# Altium footprint library PcbLib.PcbLib: 428 footprints (part 10 of 27)
Each footprint in its own frame and in the unit in brackets; x right, y up, seen from the top. Pads: shape width x height; smd on the part's side, far side on the other; paste and mask are expansions set on the pad; w line width, h text height; cw(c..) or ccw(c..) is an arc to the next point about the centre after c.
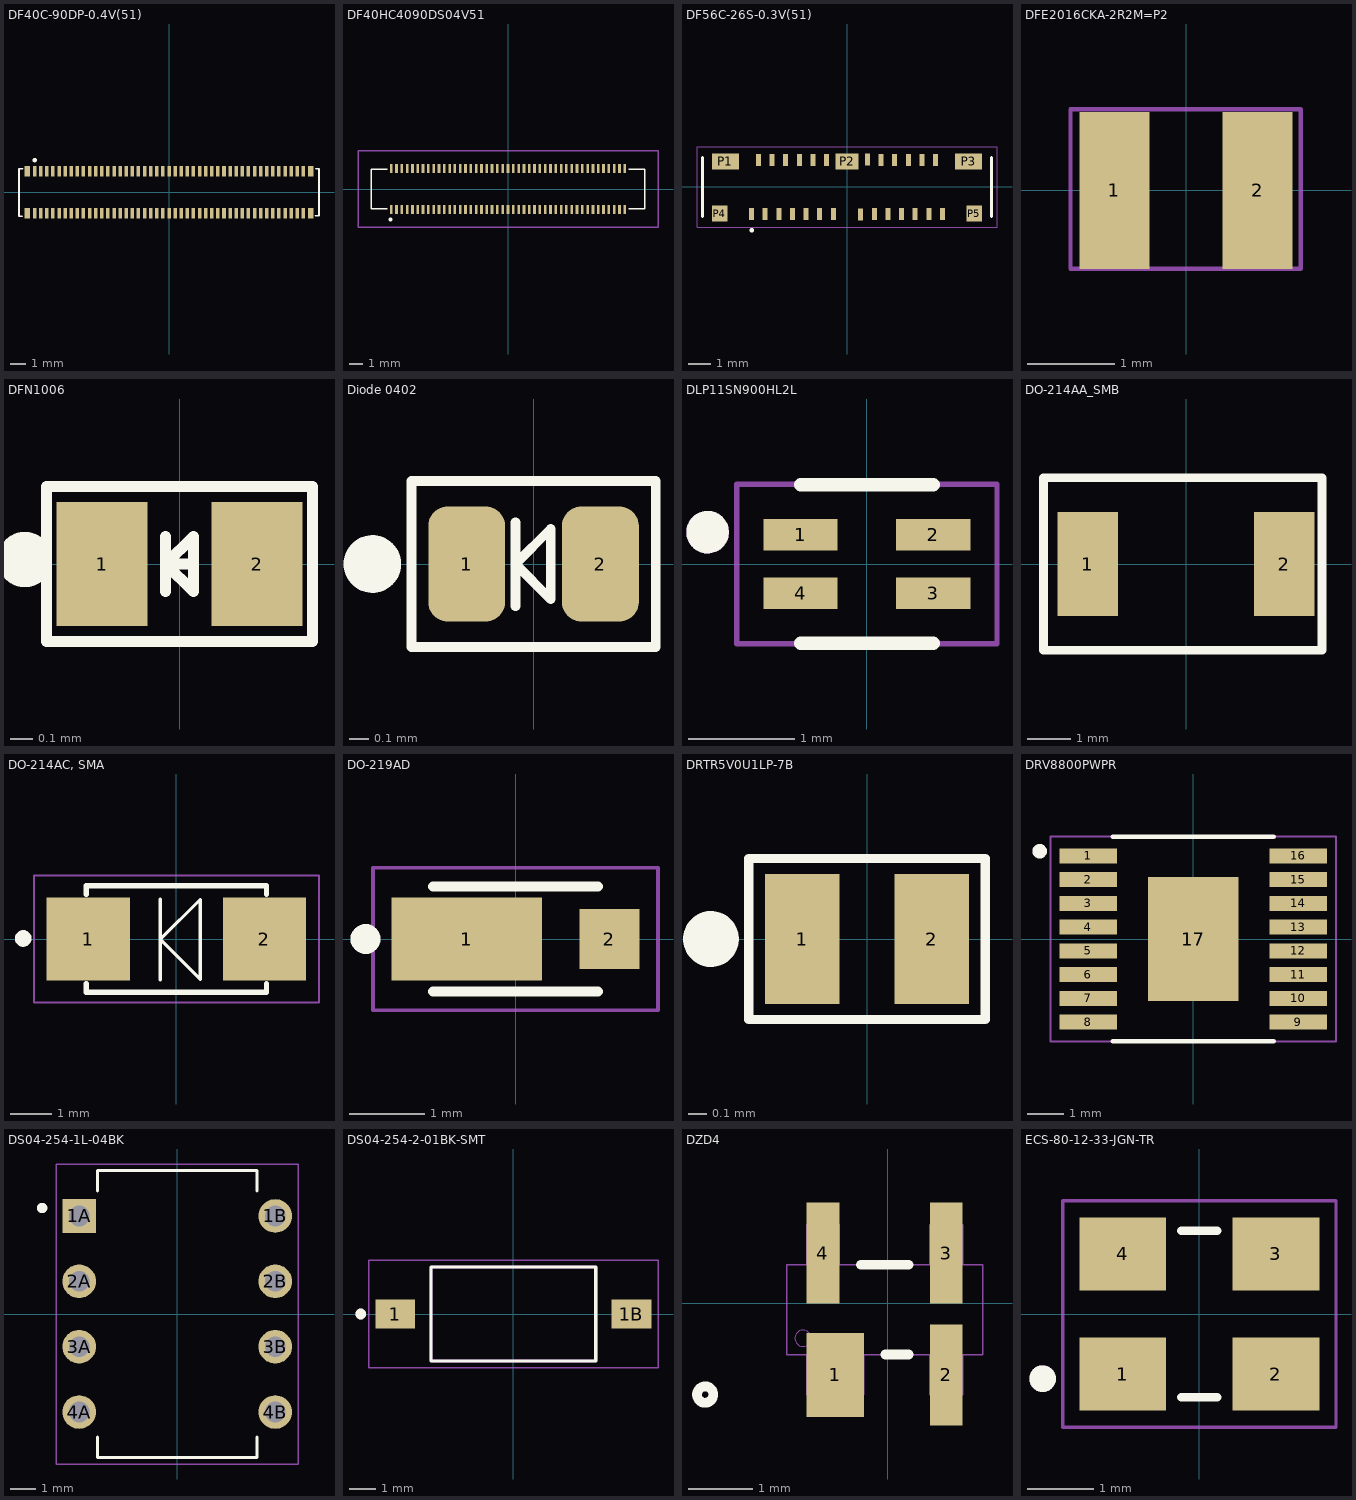
[diagram p9: the footprints below, top view; thin cyan lines are the x and y axes]

## DF40C-90DP-0.4V(51) [mm]
pads (94):
  rect 0.23x0.7 smd: 1(-8.8,1.37) 2(-8.4,1.37) 3(-8,1.37) 4(-7.6,1.37) 5(-7.2,1.37) 6(-6.8,1.37) 7(-6.4,1.37) 8(-6,1.37) 9(-5.6,1.37) 10(-5.2,1.37) 11(-4.8,1.37) 12(-4.4,1.37) 13(-4,1.37) 14(-3.6,1.37) 15(-3.2,1.37) 16(-2.8,1.37) 17(-2.4,1.37) 18(-2,1.37) 19(-1.6,1.37) 20(-1.2,1.37) 21(-0.8,1.37) 22(-0.4,1.37) 23(0,1.37) 24(0.4,1.37) 25(0.8,1.37) 26(1.2,1.37) 27(1.6,1.37) 28(2,1.37) 29(2.4,1.37) 30(2.8,1.37) 31(3.2,1.37) 32(3.6,1.37) 33(4,1.37) 34(4.4,1.37) 35(4.8,1.37) 36(5.2,1.37) 37(5.6,1.37) 38(6,1.37) 39(6.4,1.37) 40(6.8,1.37) 41(7.2,1.37) 42(7.6,1.37) 43(8,1.37) 44(8.4,1.37) 45(8.8,1.37) 46(8.8,-1.38) 47(8.4,-1.38) 48(8,-1.38) 49(7.6,-1.38) 50(7.2,-1.38) 51(6.8,-1.38) 52(6.4,-1.38) 53(6,-1.38) 54(5.6,-1.38) 55(5.2,-1.38) 56(4.8,-1.38) 57(4.4,-1.38) 58(4,-1.38) 59(3.6,-1.38) 60(3.2,-1.38) 61(2.8,-1.38) 62(2.4,-1.38) 63(2,-1.38) 64(1.6,-1.38) 65(1.2,-1.38) 66(0.8,-1.38) 67(0.4,-1.38) 68(0,-1.38) 69(-0.4,-1.38) 70(-0.8,-1.38) 71(-1.2,-1.38) 72(-1.6,-1.38) 73(-2,-1.38) 74(-2.4,-1.38) 75(-2.8,-1.38) 76(-3.2,-1.38) 77(-3.6,-1.38) 78(-4,-1.38) 79(-4.4,-1.38) 80(-4.8,-1.38) 81(-5.2,-1.38) 82(-5.6,-1.38) 83(-6,-1.38) 84(-6.4,-1.38) 85(-6.8,-1.38) 86(-7.2,-1.38) 87(-7.6,-1.38) 88(-8,-1.38) 89(-8.4,-1.38) 90(-8.8,-1.38)
  rect 0.35x0.7 smd: S1(-9.275,-1.38) S2(9.275,-1.38) S3(9.275,1.37) S4(-9.275,1.37)
Top Overlay:
  lines w0.1: -9.605,-1.561 -9.823,-1.561 -9.823,1.54 -9.586,1.54 ; 9.591,-1.55 9.821,-1.55 9.821,1.537 9.614,1.537
  lines w0.2: -8.843,2.108 ccw(c-8.793,2.108) -8.743,2.108 ; -8.843,2.108 ccw(c-8.793,2.108) -8.743,2.108 ; -8.843,2.108 cw(c-8.793,2.108) -8.743,2.108
3D body "df40c-90dp-0_4v_51_.stp": height 1.14, standoff 0, extent -9.757,-1.497 9.763,1.473

## DF40HC4090DS04V51 [mm]
pads (90):
  rect 0.2x0.7 smd: 1(-8.8,-1.54) 2(-8.4,-1.54) 3(-8,-1.54) 4(-7.6,-1.54) 5(-7.2,-1.54) 6(-6.8,-1.54) 7(-6.4,-1.54) 8(-6,-1.54) 9(-5.6,-1.54) 10(-5.2,-1.54) 11(-4.8,-1.54) 12(-4.4,-1.54) 13(-4,-1.54) 14(-3.6,-1.54) 15(-3.2,-1.54) 16(-2.8,-1.54) 17(-2.4,-1.54) 18(-2,-1.54) 19(-1.6,-1.54) 20(-1.2,-1.54) 21(-0.8,-1.54) 22(-0.4,-1.54) 23(0,-1.54) 24(0.4,-1.54) 25(0.8,-1.54) 26(1.2,-1.54) 27(1.6,-1.54) 28(2,-1.54) 29(2.4,-1.54) 30(2.8,-1.54) 31(3.2,-1.54) 32(3.6,-1.54) 33(4,-1.54) 34(4.4,-1.54) 35(4.8,-1.54) 36(5.2,-1.54) 37(5.6,-1.54) 38(6,-1.54) 39(6.4,-1.54) 40(6.8,-1.54) 41(7.2,-1.54) 42(7.6,-1.54) 43(8,-1.54) 44(8.4,-1.54) 45(8.8,-1.54) 46(8.8,1.54) 47(8.4,1.54) 48(8,1.54) 49(7.6,1.54) 50(7.2,1.54) 51(6.8,1.54) 52(6.4,1.54) 53(6,1.54) 54(5.6,1.54) 55(5.2,1.54) 56(4.8,1.54) 57(4.4,1.54) 58(4,1.54) 59(3.6,1.54) 60(3.2,1.54) 61(2.8,1.54) 62(2.4,1.54) 63(2,1.54) 64(1.6,1.54) 65(1.2,1.54) 66(0.8,1.54) 67(0.4,1.54) 68(0,1.54) 69(-0.4,1.54) 70(-0.8,1.54) 71(-1.2,1.54) 72(-1.6,1.54) 73(-2,1.54) 74(-2.4,1.54) 75(-2.8,1.54) 76(-3.2,1.54) 77(-3.6,1.54) 78(-4,1.54) 79(-4.4,1.54) 80(-4.8,1.54) 81(-5.2,1.54) 82(-5.6,1.54) 83(-6,1.54) 84(-6.4,1.54) 85(-6.8,1.54) 86(-7.2,1.54) 87(-7.6,1.54) 88(-8,1.54) 89(-8.4,1.54) 90(-8.8,1.54)
Top Overlay:
  lines w0.1: -10.3,-1.47 -10.3,1.47 ; -10.3,-1.47 -10.3,1.47 ; -10.3,-1.47 -9.1,-1.47 -10.3,-1.47 ; -10.3,1.47 -9.1,1.47 -10.3,1.47 ; 10.3,-1.47 10.3,1.47 ; 10.3,-1.47 10.3,1.47 ; 10.3,-1.47 9.1,-1.47 10.3,-1.47 ; 10.3,1.47 9.1,1.47 10.3,1.47
  lines w0.2: -8.9,-2.3 ccw(c-8.85,-2.3) -8.8,-2.3 ; -8.9,-2.3 cw(c-8.85,-2.3) -8.8,-2.3 ; -8.9,-2.3 ccw(c-8.85,-2.3) -8.8,-2.3
Mechanical 15:
  lines w0.1: -11.3,-2.89 11.3,-2.89 11.3,2.89 -11.3,2.89 -11.3,-2.89
3D body "df40hc_4_0_-90ds-0_4v_51_.stp": height 3.9, standoff 0, extent -10.306,-1.706 10.294,1.674

## DF56C-26S-0.3V(51) [mm]
pads (31):
  rect 0.22x0.52 smd: 1(-4.2,-1.185) 2(-3.9,1.185) 3(-3.6,-1.185) 4(-3.3,1.185) 5(-3,-1.185) 6(-2.7,1.185) 7(-2.4,-1.185) 8(-2.1,1.185) 9(-1.8,-1.185) 10(-1.5,1.185) 11(-1.2,-1.185) 12(-0.9,1.185) 13(-0.6,-1.185) 14(0.6,-1.215) 15(0.9,1.215) 16(1.2,-1.185) 17(1.5,1.185) 18(1.8,-1.185) 19(2.1,1.185) 20(2.4,-1.185) 21(2.7,1.185) 22(3,-1.185) 23(3.3,1.185) 24(3.6,-1.185) 25(3.9,1.185) 26(4.2,-1.185)
  rect 1.2x0.7 smd: P1(-5.35,1.125) P3(5.35,1.125)
  rect 1x0.7 smd: P2(0,1.125)
  rect 0.7x0.7 smd: P4(-5.6,-1.175) P5(5.6,-1.175)
Top Overlay:
  circle w0.1: c-4.191,-1.905 r0.05
  lines w0.127: -6.35,-1.3 -6.35,1.3 ; 6.35,-1.3 6.35,1.3
Mechanical 15:
  lines w0.05: -6.6,-1.775 -6.6,1.775 6.6,1.775 6.6,-1.775 -6.6,-1.775
3D body "DF56C-26S-0.3V.stp": height 1.47, standoff 0.02, extent -6.35,-1.27 6.35,1.33

## DFE2016CKA-2R2M=P2 [mm]
pads (2):
  rect 0.8x1.8 smd: 1(-0.825,0) 2(0.815,0)
Mechanical 15:
  lines w0.05: -1.33,-0.9 1.31,-0.9 1.31,0.93 -1.33,0.93 -1.33,-0.9
3D body "DFE2016CKA-2R2M-P2--3DModel-STEP-1.STEP": height 0.65, standoff 0, extent -0.99,-0.79 1.01,0.81

## DFN1006 [mm]
pads (2):
  rect 0.41x0.56 smd: 1(-0.35,0) 2(0.35,0)
Top Overlay:
  circle w0.2: c-0.7,0.02 r0.025
  lines w0.05: -0.063,-0.125 -0.063,0.125 ; 0.062,0 -0.063,0 ; -0.063,0 0.062,-0.125 0.062,0.125 -0.063,0 ; -0.6,-0.35 0.6,-0.35 0.6,0.35 -0.6,0.35 -0.6,-0.35
3D body "BAT54LP-7.STEP": height 0.53, standoff 0, extent -0.5,-0.3 0.5,0.3

## Diode 0402 [mm]
pads (2):
  rrect50% 0.4x0.6 smd paste-0.019 mask+0.07: 1(-0.348,0) 2(0.348,0)
Top Overlay:
  circle w0.15: c-0.838,0 r0.075
  lines w0.05: -0.094,-0.22 -0.094,0.216 ; -0.635,-0.432 -0.635,0.432 0.635,0.432 0.635,-0.432 -0.635,-0.432 ; -0.094,0 0.09,-0.184 0.09,0.184 -0.094,0
3D body "step_temp.STEP": height 0.45, standoff 0, extent -0.5,-0.3 0.5,0.3

## DLP11SN900HL2L [mm]
height 0.92
pads (4):
  rect 0.7x0.3 smd: 1(-0.625,0.275) 2(0.625,0.275) 3(0.625,-0.275) 4(-0.625,-0.275)
Top Overlay:
  circle w0.2: c-1.5,0.3 r0.1
  lines w0.127: -0.625,-0.745 0.625,-0.745 ; -0.625,0.745 0.625,0.745
Mechanical 13:
  circle w0.2: c-1.5,0.3 r0.1
Mechanical 15:
  lines w0.05: -1.225,-0.75 -1.225,0.75 1.225,0.75 1.225,-0.75 -1.225,-0.75
3D body "step_temp.STEP": height 0.92, standoff 0, extent -0.625,-0.5 0.625,0.5

## DO-214AA_SMB [mm]
pads (2):
  rect 1.4x2.4 smd: 1(-2.275,0) 2(2.275,0)
Top Overlay:
  lines w0.2: -3.3,-2 -3.3,2 3.15,2 3.15,-2 -3.3,-2
3D body "p26_SMB_DO-214AA.stp": height 2.18, standoff -0.02, extent -2.7,-1.85 2.7,1.85

## DO-214AC, SMA [mm]
pads (2):
  rect 2x2 smd: 1(-2.115,0) 2(2.115,0)
Top Overlay:
  circle w0.2: c-3.68,0.013 r0.1
  lines w0.076: -0.389,-0.986 -0.389,0.963 ; -0.389,-0.01 0.572,-0.97 0.572,0.95 -0.389,-0.01
  lines w0.127: -2.165,-1.07 -2.165,-1.28 2.165,-1.28 2.165,-1.07 ; -2.165,1.07 -2.165,1.28 2.165,1.28 2.165,1.07
Mechanical 15:
  lines w0.05: -3.425,-1.53 -3.425,1.53 3.425,1.53 3.425,-1.53 -3.425,-1.53
3D body "SK34A.STEP": height 2.5, standoff 0, extent -2.57,-1.28 2.57,1.28

## DO-219AD [mm]
pads (2):
  rect 2x1.1 smd: 1(-0.65,0)
  rect 0.8x0.8 smd: 2(1.25,0)
Top Overlay:
  circle w0.2: c-2,0 r0.1
  lines w0.127: -1.1,-0.7 1.1,-0.7 ; -1.1,0.7 1.1,0.7
Mechanical 15:
  lines w0.05: -1.9,-0.95 -1.9,0.95 1.9,0.95 1.9,-0.95 -1.9,-0.95
3D body "89A.STEP": height 0.73, standoff 0, extent -0.996,-0.665 1.504,0.635

## DRTR5V0U1LP-7B [mm]
pads (2):
  rect 0.4x0.7 smd: 1(-0.348,0) 2(0.348,0)
Top Overlay:
  circle w0.15: c-0.838,0 r0.075
  lines w0.05: -0.635,-0.432 -0.635,0.432 0.635,0.432 0.635,-0.432 -0.635,-0.432
3D body "step_temp.STEP": height 0.45, standoff 0, extent -0.5,-0.3 0.5,0.3

## DRV8800PWPR [mm]
pads (17):
  rect 1.57x0.41 smd: 1(-2.87,2.275) 2(-2.87,1.625) 3(-2.87,0.975) 4(-2.87,0.325) 5(-2.87,-0.325) 6(-2.87,-0.975) 7(-2.87,-1.625) 8(-2.87,-2.275) 9(2.87,-2.275) 10(2.87,-1.625) 11(2.87,-0.975) 12(2.87,-0.325) 13(2.87,0.325) 14(2.87,0.975) 15(2.87,1.625) 16(2.87,2.275)
  rect 2.48x3.4 smd paste-3: 17(0,0)
Top Overlay:
  circle w0.2: c-4.2,2.4 r0.1
  lines w0.127: -2.2,-2.8 2.2,-2.8 ; -2.2,2.8 2.2,2.8
Top Paste:
  region: 0.8,-1.075 -0.8,-1.075 -0.8,1.075 0.8,1.075
Mechanical 15:
  lines w0.05: -3.905,-2.8 -3.905,2.8 3.905,2.8 3.905,-2.8 -3.905,-2.8
3D body "DRV8800PWPR.STEP": height 1.2, standoff 0, extent -3.2,-2.5 3.2,2.5

## DS04-254-1L-04BK [mm]
height 3.96
pads (8):
  rect 1.308x1.308 hole 0.8: 1A(-3.81,3.81)
  round 1.308 hole 0.8: 1B(3.81,3.81) 2A(-3.81,1.27) 2B(3.81,1.27) 3A(-3.81,-1.27) 3B(3.81,-1.27) 4A(-3.81,-3.81) 4B(3.81,-3.81)
Top Overlay:
  circle w0.2: c-5.25,4.12 r0.1
  lines w0.127: -3.1,-4.79 -3.1,-5.58 3.1,-5.58 3.1,-4.79 ; -3.1,4.79 -3.1,5.58 3.1,5.58 3.1,4.79
Mechanical 15:
  lines w0.05: -4.71,-5.83 4.71,-5.83 4.71,5.83 -4.71,5.83 -4.71,-5.83
3D body "CUI_DEVICES_DS04-254-1L-04BK.step": height 4.44, standoff -4.05, extent -4.022,-5.646 3.848,5.515

## DS04-254-2-01BK-SMT [mm]
height 4.86
pads (2):
  rect 1.5x1.1 smd: 1(-4.45,0) 1B(4.45,0)
Top Overlay:
  circle w0.2: c-5.75,0 r0.1
  lines w0.127: -3.1,-1.77 -3.1,1.77 3.1,1.77 3.1,-1.77 -3.1,-1.77
Mechanical 13:
  circle w0.2: c-5.75,0 r0.1
  lines w0.127: -3.1,-1.77 -3.1,1.77 3.1,1.77 3.1,-1.77 -3.1,-1.77
Mechanical 15:
  lines w0.05: -5.45,-2.02 5.45,-2.02 5.45,2.02 -5.45,2.02 -5.45,-2.02
3D body "Same_Sky_DS04-254-2-01BK-SMT.step": height 4.09, standoff 0.09, extent -4.95,-1.77 4.95,1.77

## DZD4 [mil]
pads (4):
  rect 35x51.56 smd paste+0 mask+0: 1(-32.3,-44)
  rect 20x62.06 smd paste+0 mask+0: 2(35.8,-44) 3(35.8,30.75) 4(-39.8,30.75)
Top Overlay:
  circle w6: c-112,-56 r5
  lines w6: -16.7,23.5 12.7,23.5 ; -1.7,-31.5 12.7,-31.5
Mechanical 13:
  circle w0: c-52,-21.5 r5
  lines w1: -62,-31.5 58,-31.5 58,23.5 -62,23.5 -62,-31.5 ; -49.8,-56 -49.8,-31.5 -14.8,-31.5 -14.8,-56 -49.8,-56 ; -49.8,23.5 -29.8,23.5 -29.8,48 -49.8,48 -49.8,23.5 ; 25.8,-56 25.8,-31.5 45.8,-31.5 45.8,-56 25.8,-56 ; 25.8,23.5 45.8,23.5 45.8,48 25.8,48 25.8,23.5
3D body "DZD4.step": height 48.11, standoff 0, extent -62,-56.01 58,48.01

## ECS-80-12-33-JGN-TR [mm]
pads (4):
  rect 1.3x1.1 smd: 1(-1.15,-0.9) 2(1.15,-0.9) 3(1.15,0.9) 4(-1.15,0.9)
Top Overlay:
  circle w0.2: c-2.35,-0.97 r0.1
  lines w0.127: -0.27,-1.25 0.27,-1.25 ; -0.27,1.25 0.27,1.25
Mechanical 13:
  circle w0.2: c-2.35,-0.97 r0.1
Mechanical 15:
  lines w0.05: -2.05,-1.7 2.05,-1.7 2.05,1.7 -2.05,1.7 -2.05,-1.7
3D body "ECS-80-12-33-JGN-TR.STEP": height 0.8, standoff 0, extent -1.6,-1.25 1.6,1.25